# Altium footprint library DIOT_PSU_integrated.PcbLib: 35 footprints (part 2 of 3)
Each footprint in its own frame and in the unit in brackets; x right, y up, seen from the top. Pads: shape width x height; smd on the part's side, far side on the other; paste and mask are expansions set on the pad; w line width, h text height; cw(c..) or ccw(c..) is an arc to the next point about the centre after c.
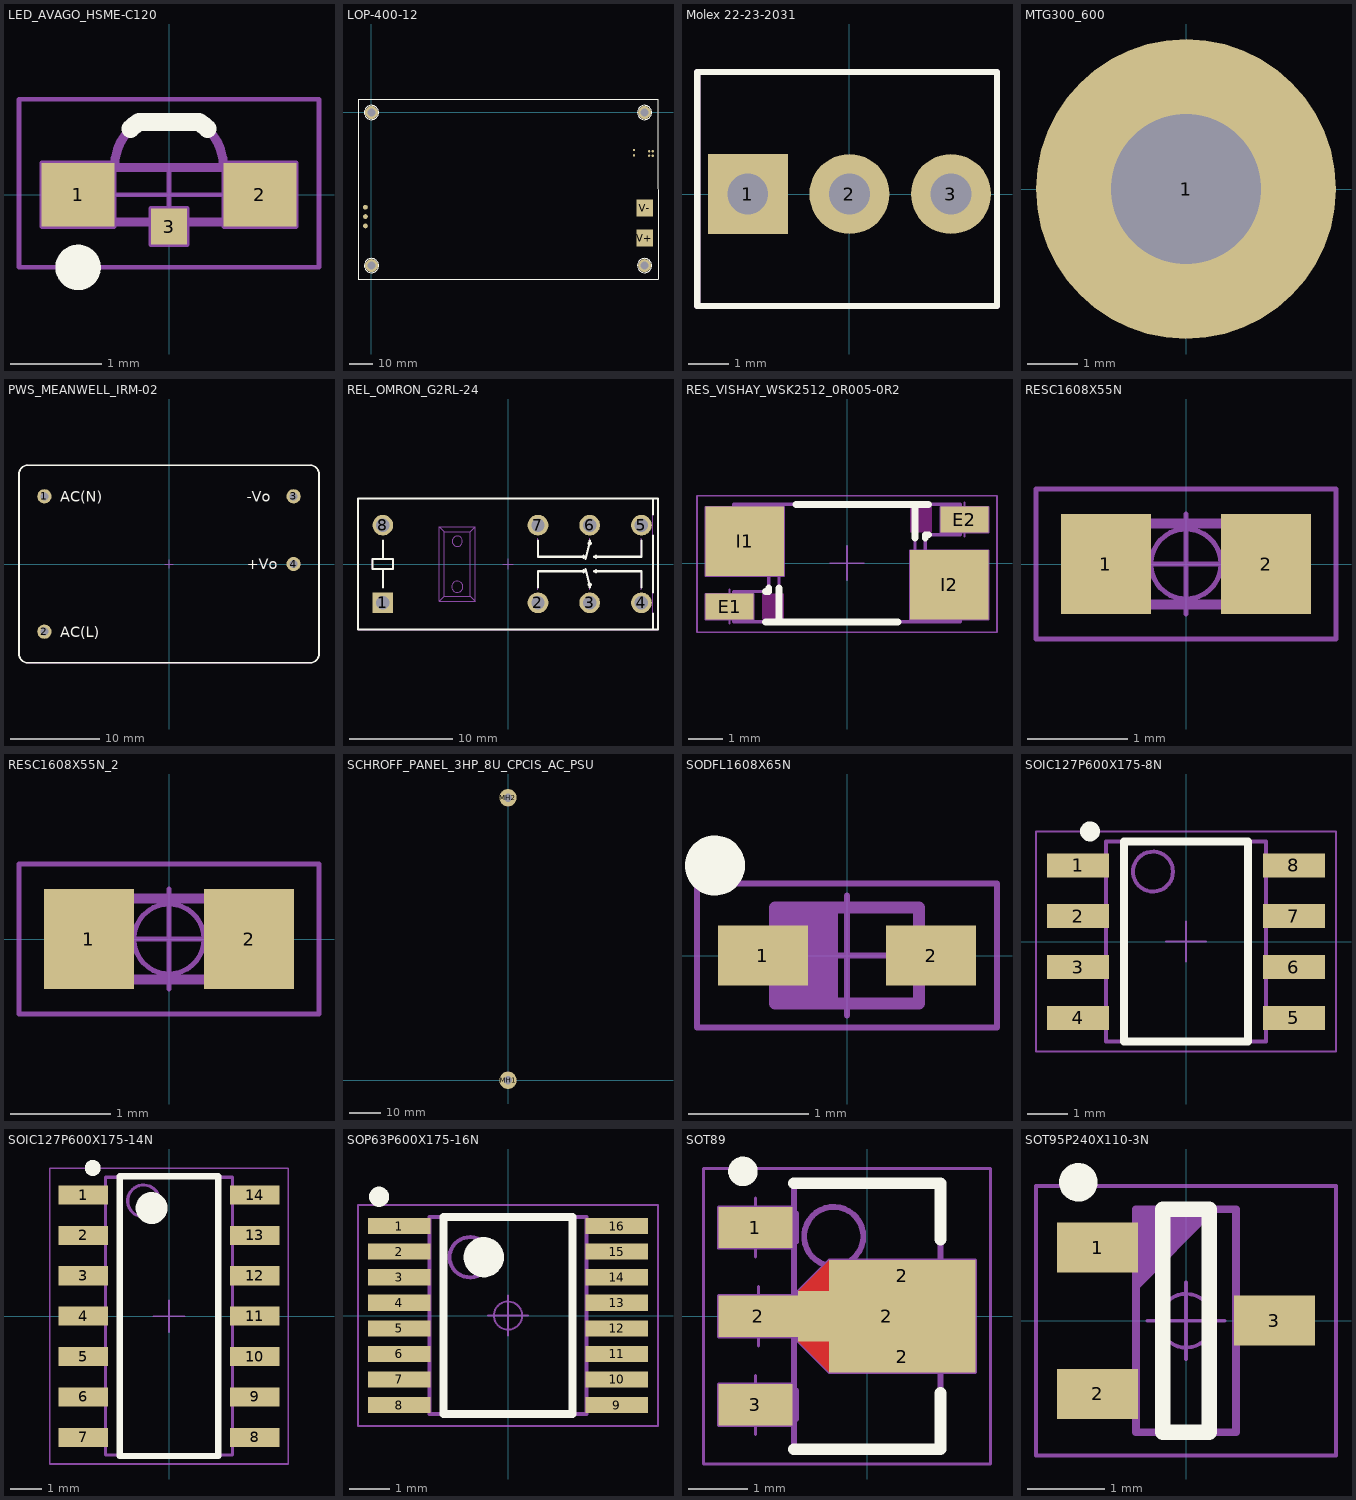
[diagram p1: the footprints below, top view; thin cyan lines are the x and y axes]

## LED_AVAGO_HSME-C120 [mm]
pads (3):
  rect 0.8x0.7 smd: 1(-1,0) 2(1,0)
  rect 0.4x0.4 smd: 3(0,-0.35)
Top Overlay:
  circle w0.25: c-1,-0.8 r0.125
  lines w0.2: -0.424,0.724 cw(c0,0.3) -0.332,0.8 0.332,0.8 cw(c0,0.3) 0.424,0.724
Mechanical 8:
  lines w0.05: -1,0 1,0 ; 0,-0.35 0,0 ; -1.4,-0.35 -1.4,0.35 -0.6,0.35 -0.6,-0.35 -1.4,-0.35 ; -0.2,-0.55 0.2,-0.55 0.2,-0.15 -0.2,-0.15 -0.2,-0.55 ; 0.6,-0.35 0.6,0.35 1.4,0.35 1.4,-0.35 0.6,-0.35
Mechanical 14:
  lines w0.1: -0.6,0.3 cw(c0,0.3) -0.332,0.8 0.332,0.8 cw(c0,0.3) 0.6,0.3 ; -0.85,-0.3 0.85,-0.3 0.85,0.3 -0.85,0.3 -0.85,-0.3
Mechanical 15:
  lines w0.05: -0.3,0 0.3,0 ; 0,-0.3 0,0.3 ; -1.65,-0.8 -1.65,1.05 1.65,1.05 1.65,-0.8 -1.65,-0.8
3D body "LED_AVAGO_HSME-C120.stp": height 0.7, standoff 0, extent -0.85,-0.3 0.85,0.8

## LOP-400-12 [mm]
pads (15):
  round 2 smd: CN1.1(-2.565,-48.02) CN1.2(-2.565,-44.06) CN1.3(-2.565,-40.1)
  round 1 smd: CN2.1(111.115,-18.152) CN2.2(111.115,-15.852) CN3.1(119.079,-18.273) CN3.2(119.079,-16.413) CN3.3(117.509,-16.413) CN3.4(117.509,-18.273)
  round 5.5 / inner round 3.5 / far side round 5.5 hole 3.5: FG1(0,0) FG2(0,-64.8) FG3(115.6,-64.8) MH1(115.6,0)
  rect 7x7 smd: V+(115.623,-53.135) V-(115.623,-40.435)
Top Overlay:
  circle w0.2: c115.6,0 r3
  circle w0.2: c115.6,-64.8 r3
  circle w0.2: c0,-64.8 r3
  circle w0.2: c0,0 r3
  lines w0.2: -5.715,-70.485 -5.715,5.715 121.285,5.715 121.285,-70.485 -5.715,-70.485
Mechanical 14:
  text ".Designator .Designator" at 32.107,-24.941 h2
3D body "LOP-400-12.stp": height 32.56, standoff -8.7, extent -6.365,-70.685 121.285,5.715

## Molex 22-23-2031 [mm]
pads (3):
  rect 2x2 hole 1.02: 1(-2.54,0)
  round 2 hole 1.02: 2(0,0) 3(2.54,0)
Top Overlay:
  lines w0.152: -3.81,-2.794 3.69,-2.794 ; -3.803,-2.752 -3.803,3.048 3.69,3.048 3.69,-2.752
Mechanical 5:
  lines w0.152: -3.81,-2.794 3.69,-2.794 ; -3.803,-2.752 -3.803,3.048 3.69,3.048 3.69,-2.752
  text "'.Designator' / '.ComponentSymbol'" at -3.8,-1.05 h0.76
3D body "Molex 3-Pin Header with Lock (0.100in pitch).STEP": height 10.69, standoff -3.53, extent -3.8,-3.15 3.82,3.2

## MTG300_600 [mm]
pads (1):
  round 6 hole 3: 1(0,0)

## PWS_MEANWELL_IRM-02 [mm]
pads (4):
  round 1.6 hole 0.9: 1(-14,7.6) 2(-14,-7.6) 3(14,7.6) 4(14,0)
Top Overlay:
  lines w0.2: -16.85,-10.1 ccw(c-15.85,-10.1) -15.85,-11.1 15.85,-11.1 ccw(c15.85,-10.1) 16.85,-10.1 16.85,10.1 ccw(c15.85,10.1) 15.85,11.1 -15.85,11.1 ccw(c-15.85,10.1) -16.85,10.1 -16.85,-10.1
  text "AC(N)" at -12.213,6.967 h1.2
  text "-Vo" at 8.725,6.99 h1.2
  text "+Vo" at 8.725,-0.61 h1.2
  text "AC(L)" at -12.213,-8.233 h1.2
Mechanical 8:
  lines w0.05: -14.5,-7.6 -14,-7.6 ; -14.5,7.6 -14,7.6 ; -14,-8.1 -14,-7.6 ; -14,-7.1 -14,-7.6 ; -14,7.1 -14,7.6 ; -14,8.1 -14,7.6 ; -13.5,-7.6 -14,-7.6 ; -13.5,7.6 -14,7.6 ; -0.5,0 0,0 ; 0,-0.5 0,0 ; 0,0.5 0,0 ; 0.5,0 0,0 ; 13.5,0 14,0 ; 13.5,7.6 14,7.6 ; 14,-0.5 14,0 ; 14,0.5 14,0 ; 14,7.1 14,7.6 ; 14,8.1 14,7.6 ; 14.5,0 14,0 ; 14.5,7.6 14,7.6
  text "3" at 15.7,7 h1.2
  text "4" at 15.7,-0.5 h1.2
  text "2" at -16.4,-8.233 h1.2
  text "1" at -16.3,6.967 h1.2
Mechanical 14:
  lines w0.1: -16.85,-10.1 ccw(c-15.85,-10.1) -15.85,-11.1 15.85,-11.1 ccw(c15.85,-10.1) 16.85,-10.1 16.85,10.1 ccw(c15.85,10.1) 15.85,11.1 -15.85,11.1 ccw(c-15.85,10.1) -16.85,10.1 -16.85,-10.1
  text "+Vo" at 8.725,-0.61 h1.2
  text "-Vo" at 8.725,6.99 h1.2
  text "AC(N)" at -12.213,6.967 h1.2
  text "AC(L)" at -12.213,-8.233 h1.2
3D body "PWS_MEANWELL_IRM-02.stp": height 15, standoff -6, extent -16.85,-11.1 16.85,11.1

## REL_OMRON_G2RL-24 [mm]
pads (8):
  rect 2x2 hole 1.3: 1(-12.1,-3.75)
  round 2 hole 1.3: 2(2.9,-3.75) 3(7.9,-3.75) 4(12.9,-3.75) 5(12.9,3.75) 6(7.9,3.75) 7(2.9,3.75) 8(-12.1,3.75)
Top Overlay:
  circle w0.2: c7.9,-2 r0.1
  circle w0.2: c7.9,2 r0.1
  lines w0.2: -12.1,-2.25 -12.1,-0.5 ; -12.1,0.5 -12.1,2.25 ; 2.9,-2.25 2.9,-0.7 7.3,-0.7 ; 2.9,2.25 2.9,0.7 7.3,0.7 ; 7.5,-0.5 7.9,-2 7.9,-2.25 ; 7.5,0.5 7.9,2 7.9,2.25 ; 8.5,-0.7 12.9,-0.7 12.9,-2.25 ; 8.5,0.7 12.9,0.7 12.9,2.25 ; 14,-6.35 14,-4.77 ; 14,-2.73 14,2.73 ; 14,4.77 14,6.35 ; -14.5,-6.35 14.5,-6.35 14.5,6.35 -14.5,6.35 -14.5,-6.35 ; -13.1,-0.5 -11.1,-0.5 -11.1,0.5 -13.1,0.5 -13.1,-0.5 ; 7.3,-0.8 7.3,-0.6 7.5,-0.7 7.3,-0.8 ; 7.3,0.6 7.3,0.8 7.5,0.7 7.3,0.6 ; 8.3,-0.7 8.5,-0.6 8.5,-0.8 8.3,-0.7 ; 8.3,0.7 8.5,0.6 8.5,0.8 8.3,0.7
Mechanical 8:
  lines w0.1: -12.6,-3.75 -12.1,-3.75 -12.1,-4.25 ; -12.6,3.75 -12.1,3.75 -12.1,3.25 ; -0.5,0 0,0 ; 0,-0.5 0,0 ; 0,0.5 0,0 ; 0.5,0 0,0 ; 2.4,-3.75 2.9,-3.75 2.9,-4.25 ; 2.4,3.75 2.9,3.75 2.9,3.25 ; 7.4,-3.75 7.9,-3.75 7.9,-4.25 ; 7.4,3.75 7.9,3.75 7.9,3.25 ; 12.4,-3.75 12.9,-3.75 12.9,-4.25 ; 12.4,3.75 12.9,3.75 12.9,3.25
Mechanical 14:
  circle w0.1: c-4.9,2.2 r0.5
  circle w0.1: c-4.9,-2.2 r0.54
  circle w0.1: c7.9,-2 r0.05
  circle w0.1: c7.9,2 r0.05
  lines w0.1: -12.1,-2.25 -12.1,-0.5 ; -12.1,0.5 -12.1,2.25 ; 2.9,-2.5 2.9,-0.7 7.3,-0.7 ; 2.9,2.5 2.9,0.7 7.3,0.7 ; 7.5,-0.5 7.9,-2 7.9,-2.5 ; 7.5,0.5 7.9,2 7.9,2.5 ; 8.5,-0.7 12.9,-0.7 12.9,-2.5 ; 8.5,0.7 12.9,0.7 12.9,2.5 ; 14,-6.35 14,6.35 ; -6.65,-3.6 -3.15,-3.6 ; -6.65,-3.6 -6.65,3.6 ; -6.65,-3.6 -6.15,-3.1 ; -6.65,3.6 -3.15,3.6 ; -6.65,3.6 -6.15,3.1 ; -6.15,-3.1 -3.65,-3.1 ; -6.15,-3.1 -6.15,3.1 ; -6.15,3.1 -3.65,3.1 ; -3.65,-3.1 -3.15,-3.6 ; -3.65,-3.1 -3.65,3.1 ; -3.65,3.1 -3.15,3.6 ; -3.15,-3.6 -3.15,3.6 ; -14.5,-6.35 14.5,-6.35 14.5,6.35 -14.5,6.35 -14.5,-6.35 ; -13.1,-0.5 -11.1,-0.5 -11.1,0.5 -13.1,0.5 -13.1,-0.5 ; 7.3,-0.8 7.3,-0.6 7.5,-0.7 7.3,-0.8 ; 7.3,0.6 7.3,0.8 7.5,0.7 7.3,0.6 ; 8.3,-0.7 8.5,-0.6 8.5,-0.8 8.3,-0.7 ; 8.3,0.7 8.5,0.6 8.5,0.8 8.3,0.7
3D body "REL_OMRON_G2RL-24.stp": height 15.7, standoff -3.5, extent -14.5,-6.35 14.5,6.35

## RES_VISHAY_WSK2512_0R005-0R2 [mm]
pads (4):
  rect 1.4x0.76 smd: E1(-3.43,-1.27) E2(3.43,1.27)
  rect 2.29x2.03 smd: I1(-2.985,0.635) I2(2.985,-0.635)
Top Layer keep-out:
  rectangle: -2.48,-1.65 -1.84,-0.89
  region: 2.48,1.65 1.84,1.65 1.84,0.89 2.48,0.89
Top Overlay:
  lines w0.2: -2.38,-1.717 -1.985,-1.717 ; -2.38,-0.828 -2.286,-0.828 -2.286,-0.73 ; -1.985,-0.73 -1.985,-1.717 ; -1.49,1.717 1.985,1.717 ; 1.49,-1.717 -1.985,-1.717 ; 1.985,0.73 1.985,1.717 ; 2.286,0.73 2.286,0.828 2.38,0.828 ; 2.38,1.717 1.985,1.717
Mechanical 8:
  lines w0.05: -3.93,-1.27 -3.43,-1.27 ; -3.485,0.635 -2.985,0.635 ; -3.43,-1.77 -3.43,-1.27 ; -3.43,-0.77 -3.43,-1.27 ; -2.985,0.135 -2.985,0.635 ; -2.985,1.135 -2.985,0.635 ; -2.93,-1.27 -3.43,-1.27 ; -2.485,0.635 -2.985,0.635 ; -0.5,0 0,0 ; 0,-0.5 0,0 ; 0,0.5 0,0 ; 0.5,0 0,0 ; 2.485,-0.635 2.985,-0.635 ; 2.93,1.27 3.43,1.27 ; 2.985,-1.135 2.985,-0.635 ; 2.985,-0.135 2.985,-0.635 ; 3.43,0.77 3.43,1.27 ; 3.43,1.77 3.43,1.27 ; 3.485,-0.635 2.985,-0.635 ; 3.93,1.27 3.43,1.27 ; -4.13,-1.65 -4.13,-0.89 -2.73,-0.89 -2.73,-1.65 -4.13,-1.65 ; -4.13,-0.38 -1.84,-0.38 -1.84,1.65 -4.13,1.65 -4.13,-0.38 ; 1.84,-1.65 1.84,0.38 4.13,0.38 4.13,-1.65 1.84,-1.65 ; 2.73,0.89 4.13,0.89 4.13,1.65 2.73,1.65 2.73,0.89
Mechanical 14:
  lines w0.1: -1.985,-1.717 -1.985,1.717 ; -1.985,-1.717 1.985,-1.717 ; -1.985,-1.717 -3.302,-1.717 -3.302,-0.828 -2.286,-0.828 -2.286,-0.32 -3.302,-0.32 -3.302,1.717 -1.985,1.717 ; -1.985,1.717 1.985,1.717 ; 1.985,-1.717 3.302,-1.717 3.302,0.32 2.286,0.32 2.286,0.828 3.302,0.828 3.302,1.717 1.985,1.717 ; 1.985,-1.717 1.985,1.717
Mechanical 15:
  lines w0.05: -4.38,-2.02 4.38,-2.02 4.38,1.967 -4.38,1.967 -4.38,-2.02
3D body "RES_VISHAY_WSK2512_0R005-0R2.stp": height 0.89, standoff 0, extent -3.302,-1.717 3.302,1.717

## RESC1608X55N [mm]
pads (2):
  rect 0.9x1 smd: 1(-0.8,0) 2(0.8,0)
Mechanical 14:
  lines w0.1: -0.8,-0.405 0.8,-0.405 0.8,0.405 -0.8,0.405 -0.8,-0.405
Mechanical 15:
  circle w0.05: c0,0 r0.35
  lines w0.05: -0.5,0 0.5,0 ; 0,-0.5 0,0.5 ; -1.5,-0.75 -1.5,0.75 1.5,0.75 1.5,-0.75 -1.5,-0.75
3D body "RESC1608X55N.stp": height 0.55, standoff 0, extent -0.875,-0.475 0.875,0.475

## RESC1608X55N_2 [mm]
pads (2):
  rect 0.9x1 smd: 1(-0.8,0) 2(0.8,0)
Mechanical 14:
  lines w0.1: -0.8,-0.405 -0.8,0.405 0.8,0.405 0.8,-0.405 -0.8,-0.405
Mechanical 15:
  circle w0.05: c0,0 r0.35
  lines w0.05: -0.5,0 0.5,0 ; 0,-0.5 0,0.5 ; -1.5,-0.75 1.5,-0.75 1.5,0.75 -1.5,0.75 -1.5,-0.75
3D body "RESC1608X55N.stp": height 0.55, standoff 0, extent -0.875,-0.475 0.875,0.475

## SCHROFF_PANEL_3HP_8U_CPCIS_AC_PSU [mm]
pads (2):
  round 5.5 / inner round 3.5 / far side round 5.5 hole 2.6: MH1(0,0) MH2(-0.01,88.95)
Mechanical 14:
  text "=.Designator" at -9.24,34.978 h2
3D body "20848589xx.step": height 37.25, standoff -3.79, extent -43.81,-21.85 16.633,108.7

## SODFL1608X65N [mm]
pads (2):
  rect 0.75x0.5 smd: 1(-0.7,0) 2(0.7,0)
Top Overlay:
  circle w0.25: c-1.1,0.75 r0.125
Mechanical 14:
  lines w0.1: -0.5,-0.4 -0.5,0.4 ; -0.425,-0.4 -0.425,0.4 ; -0.35,-0.4 -0.35,0.4 ; -0.275,-0.4 -0.275,0.4 ; -0.2,0.4 -0.2,-0.4 -0.175,-0.4 ; -0.125,-0.4 -0.125,0.4 ; -0.6,-0.4 0.6,-0.4 0.6,0.4 -0.6,0.4 -0.6,-0.4
Mechanical 15:
  lines w0.05: -0.5,0 0.5,0 ; 0,-0.5 0,0.5 ; -1.25,-0.6 1.25,-0.6 1.25,0.6 -1.25,0.6 -1.25,-0.6
3D body "SODFL1608X65N.stp": height 0.65, standoff 0, extent -0.825,-0.425 0.825,0.425

## SOIC127P600X175-8N [mm]
pads (8):
  rect 1.55x0.6 smd: 1(-2.7,1.905) 2(-2.7,0.635) 3(-2.7,-0.635) 4(-2.7,-1.905) 5(2.7,-1.905) 6(2.7,-0.635) 7(2.7,0.635) 8(2.7,1.905)
Top Overlay:
  circle w0.25: c-2.4,2.755 r0.125
  lines w0.2: -1.55,-2.5 -1.55,2.5 1.55,2.5 1.55,-2.5 -1.55,-2.5
Mechanical 14:
  circle w0.1: c-0.825,1.75 r0.5
  lines w0.1: -2,-2.5 -2,2.5 2,2.5 2,-2.5 -2,-2.5
Mechanical 15:
  lines w0.05: -0.5,0 0.5,0 ; 0,-0.5 0,0.5 ; -3.75,-2.75 -3.75,2.75 3.75,2.75 3.75,-2.75 -3.75,-2.75
3D body "SOIC127P600X175-8N.stp": height 1.75, standoff 0, extent -3.1,-2.5 3.1,2.5

## SOIC127P600X175-14N [mm]
pads (14):
  rect 1.55x0.6 smd: 1(-2.7,3.81) 2(-2.7,2.54) 3(-2.7,1.27) 4(-2.7,0) 5(-2.7,-1.27) 6(-2.7,-2.54) 7(-2.7,-3.81) 8(2.7,-3.81) 9(2.7,-2.54) 10(2.7,-1.27) 11(2.7,0) 12(2.7,1.27) 13(2.7,2.54) 14(2.7,3.81)
Top Overlay:
  circle w0.25: c-2.4,4.66 r0.125
  circle w0.5: c-0.55,3.4 r0.25
  lines w0.2: -1.55,-4.4 1.55,-4.4 1.55,4.4 -1.55,4.4 -1.55,-4.4
Mechanical 14:
  circle w0.1: c-0.8,3.625 r0.5
  lines w0.1: -2,-4.37 2,-4.37 2,4.37 -2,4.37 -2,-4.37
Mechanical 15:
  lines w0.05: -0.5,0 0.5,0 ; 0,-0.5 0,0.5 ; -3.75,-4.65 3.75,-4.65 3.75,4.65 -3.75,4.65 -3.75,-4.65
3D body "SOIC127P600X175-14N.stp": height 1.75, standoff 0, extent -3.1,-4.375 3.1,4.375

## SOP63P600X175-16N [mm]
pads (16):
  rect 1.55x0.4 smd: 1(-2.7,2.222) 2(-2.7,1.587) 3(-2.7,0.953) 4(-2.7,0.318) 5(-2.7,-0.318) 6(-2.7,-0.953) 7(-2.7,-1.587) 8(-2.7,-2.222) 9(2.7,-2.222) 10(2.7,-1.587) 11(2.7,-0.953) 12(2.7,-0.318) 13(2.7,0.318) 14(2.7,0.953) 15(2.7,1.587) 16(2.7,2.222)
Top Overlay:
  circle w0.5: c-0.6,1.45 r0.25
  circle w0.25: c-3.2,2.95 r0.125
  lines w0.2: -1.6,-2.45 1.6,-2.45 1.6,2.45 -1.6,2.45 -1.6,-2.45
Mechanical 14:
  circle w0.1: c-0.95,1.448 r0.5
  lines w0.1: -1.95,-2.448 1.95,-2.448 1.95,2.448 -1.95,2.448 -1.95,-2.448
Mechanical 15:
  circle w0.05: c0,0 r0.35
  lines w0.05: -0.5,0 0.5,0 ; 0,-0.5 0,0.5 ; -3.725,-2.745 3.725,-2.745 3.725,2.745 -3.725,2.745 -3.725,-2.745
3D body "SOP63P600X175-16N.stp": height 1.75, standoff 0, extent -3.127,-2.49 3.127,2.49

## SOT89 [mm]
pads (6):
  rect 1.25x0.7 smd: 1(-1.89,1.5) 3(-1.89,-1.5)
  rect 1.35x0.7 smd: 2(-1.84,0)
  rect 3x0.85 smd: 2(0.33,0)
  rect 2.475x0.525 smd: 2(0.592,-0.687) 2(0.592,0.687)
Top Layer:
  region: -1.165,0.425 -0.64,0.95 -0.64,-0.95 -1.165,-0.425
Top Overlay:
  circle w0.25: c-2.1,2.45 r0.125
  lines w0.2: -1.24,-2.25 1.24,-2.25 1.24,-1.3 ; -1.24,2.25 1.24,2.25 1.24,1.3
Mechanical 8:
  lines w0.05: -2.39,-1.5 -1.89,-1.5 ; -2.39,1.5 -1.89,1.5 ; -2.34,0 -1.84,0 ; -1.89,-2 -1.89,-1.5 ; -1.89,-1 -1.89,-1.5 ; -1.89,1 -1.89,1.5 ; -1.89,2 -1.89,1.5 ; -1.84,-0.5 -1.84,0 ; -1.84,0.5 -1.84,0 ; -1.39,-1.5 -1.89,-1.5 ; -1.39,1.5 -1.89,1.5 ; -1.34,0 -1.84,0 ; -1.165,-0.35 -2.515,-0.35 -2.515,0.35 -1.165,0.35 ; -0.5,0 0,0 ; 0,-0.5 0,0 ; 0,0.5 0,0 ; 0.5,0 0,0 ; -1.165,-0.425 -1.165,0.425 ; -1.165,-0.425 1.835,-0.425 ; -1.165,-0.425 -0.64,-0.95 ; -1.165,0.425 1.835,0.425 ; -1.165,0.425 -0.64,0.95 ; -0.64,-0.95 0.597,-0.687 -0.64,-0.425 -0.64,-0.95 ; -0.64,-0.95 1.835,-0.95 1.835,-0.425 ; -0.64,0.95 0.597,0.687 -0.64,0.425 -0.64,0.95 ; -0.64,0.95 1.835,0.95 1.835,0.425 ; 1.835,-0.425 0.335,0 1.835,0.425 ; 1.835,-0.425 1.835,0.425 ; -2.515,-1.85 -2.515,-1.15 -1.265,-1.15 -1.265,-1.85 -2.515,-1.85 ; -2.515,1.15 -2.515,1.85 -1.265,1.85 -1.265,1.15 -2.515,1.15
Mechanical 14:
  circle w0.1: c-0.565,1.35 r0.5
  lines w0.1: -1.24,-1.74 -1.24,-2.25 1.24,-2.25 1.24,-0.8 ; -1.24,-1.26 -1.24,-0.24 ; -1.24,0.24 -1.24,1.26 ; -1.24,1.74 -1.24,2.25 1.24,2.25 1.24,0.8 ; -2.44,-1.74 -2.44,-1.26 -1.206,-1.26 -1.206,-1.74 -2.44,-1.74 ; -2.44,-0.24 -2.44,0.24 -1.206,0.24 -1.206,-0.24 -2.44,-0.24 ; -2.44,1.26 -2.44,1.74 -1.206,1.74 -1.206,1.26 -2.44,1.26 ; 1.206,-0.8 1.206,0.8 1.61,0.8 cw(c1.61,0.6) 1.81,0.6 1.81,-0.6 cw(c1.61,-0.6) 1.61,-0.8 1.206,-0.8
Mechanical 15:
  lines w0.05: -2.765,-2.5 2.085,-2.5 2.085,2.5 -2.765,2.5 -2.765,-2.5
3D body "ANALOG-DEVICES_SOT-89(RK-3).stp": height 1.6, standoff 0, extent -2.44,-2.25 1.81,2.25

## SOT95P240X110-3N [mm]
pads (3):
  rect 1.05x0.65 smd: 1(-1.15,0.95) 2(-1.15,-0.95) 3(1.15,0)
Top Overlay:
  circle w0.25: c-1.4,1.8 r0.125
  lines w0.2: -0.3,-1.45 -0.3,1.45 0.3,1.45 0.3,-1.45 -0.3,-1.45
Mechanical 14:
  lines w0.1: -0.65,0.45 0.35,1.45 ; -0.65,0.55 0.25,1.45 ; -0.65,0.65 0.15,1.45 ; -0.65,0.75 0.05,1.45 ; -0.65,0.85 -0.05,1.45 ; -0.65,0.95 -0.15,1.45 ; -0.65,1.05 -0.25,1.45 ; -0.65,1.15 -0.35,1.45 ; -0.65,1.25 -0.45,1.45 ; -0.65,1.35 -0.55,1.45 ; -0.65,-1.45 0.65,-1.45 0.65,1.45 -0.65,1.45 -0.65,-1.45
Mechanical 15:
  circle w0.05: c0,0 r0.35
  lines w0.05: -0.5,0 0.5,0 ; 0,-0.5 0,0.5 ; -1.95,-1.75 1.95,-1.75 1.95,1.75 -1.95,1.75 -1.95,-1.75
3D body "SOT95P240X110-3N.stp": height 1.1, standoff 0, extent -1.25,-1.5 1.25,1.5